# Altium footprint library PCB_Wearing_sensor.PcbLib: 55 footprints (part 2 of 4)
Each footprint in its own frame and in the unit in brackets; x right, y up, seen from the top. Pads: shape width x height; smd on the part's side, far side on the other; paste and mask are expansions set on the pad; w line width, h text height; cw(c..) or ccw(c..) is an arc to the next point about the centre after c.
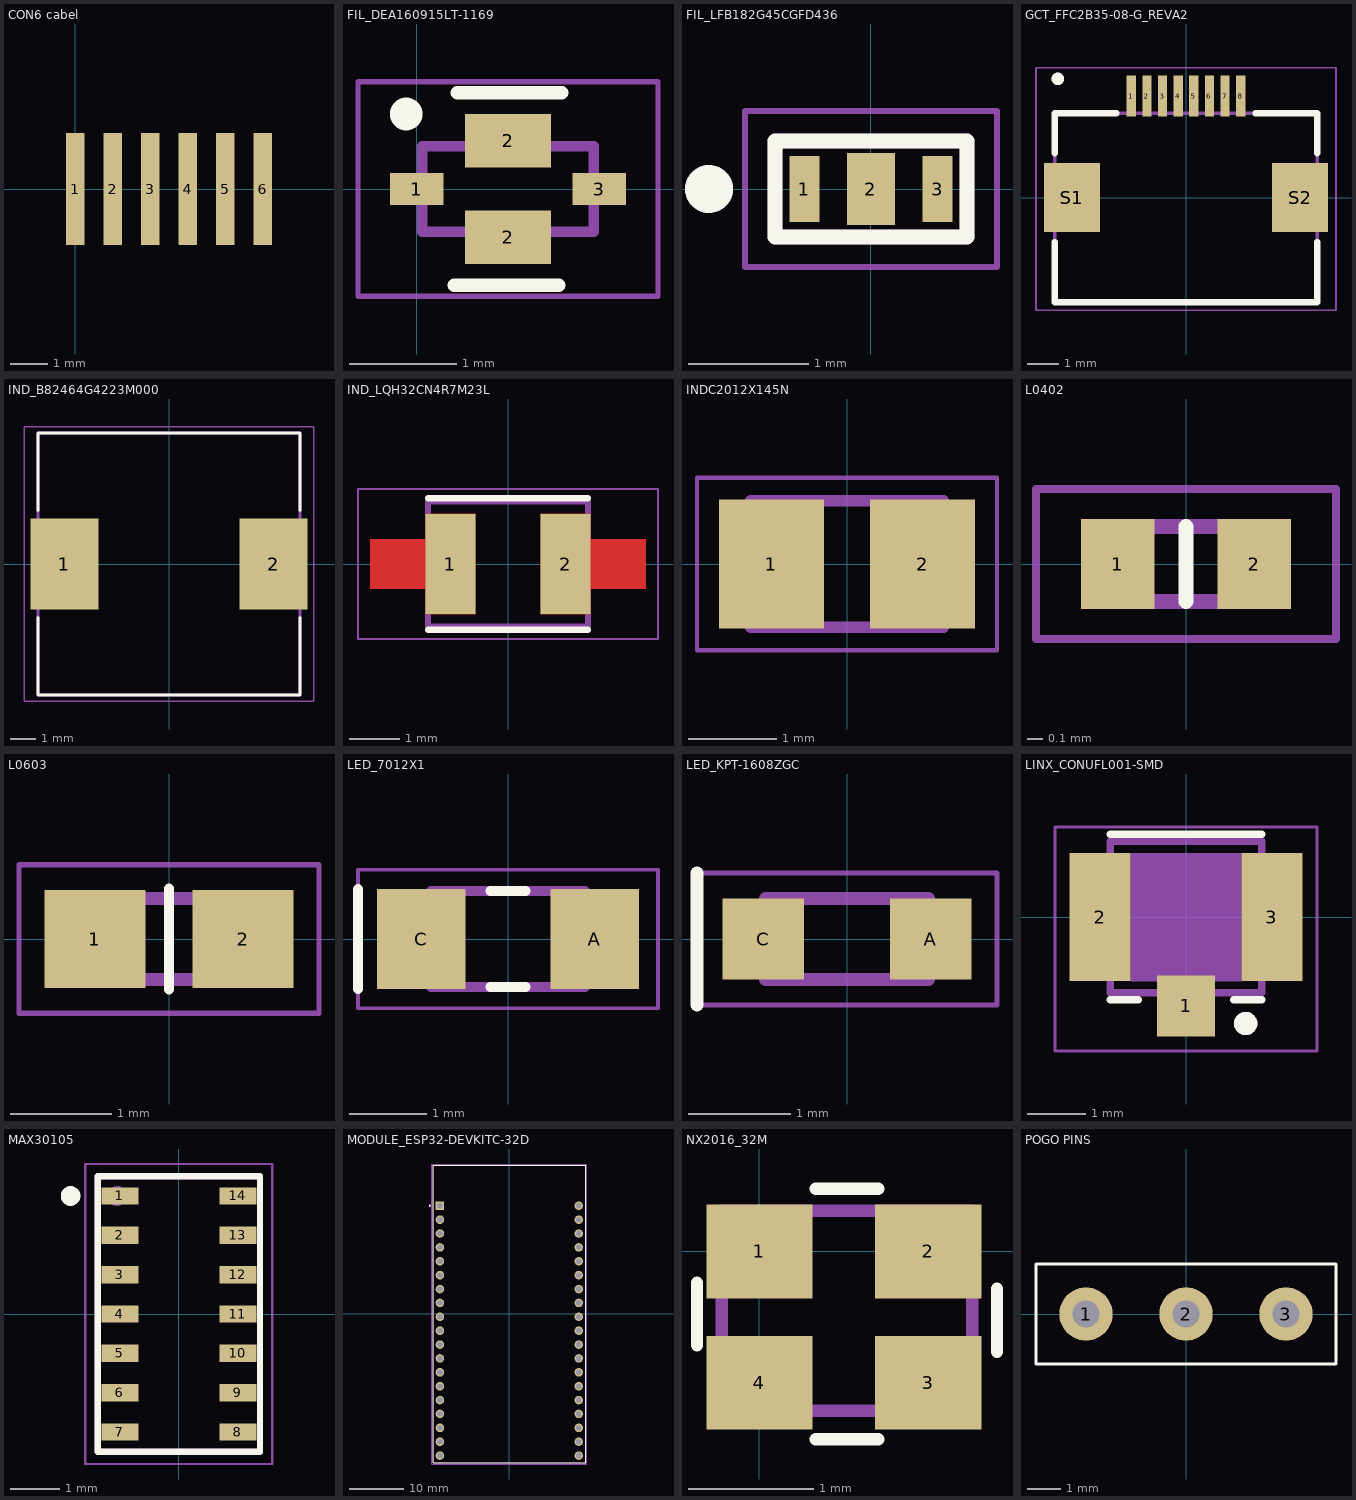
[diagram p1: the footprints below, top view; thin cyan lines are the x and y axes]

## CON6 cabel [mm]
pads (6):
  rect 0.5x3 smd: 1(0,0) 2(1,0) 3(2,0) 4(3,0) 5(4,0) 6(5,0)
Top Assy:
  text ".Designator" at -0.832,-0.32 h1.52

## FIL_DEA160915LT-1169 [mm]
pads (4):
  rect 0.5x0.3 smd: 1(0,0) 3(1.7,0)
  rect 0.8x0.5 smd: 2(0.85,-0.45) 2(0.85,0.45)
Top Overlay:
  circle w0.254: c-0.1,0.7 r0.025
  lines w0.127: 0.35,-0.9 1.325,-0.9 ; 0.375,0.9 1.35,0.9
Top Component Body:
  lines w0.1: 0.05,-0.4 0.05,0.4 1.65,0.4 1.65,-0.4 0.05,-0.4
Top Courtyard (Mech8):
  lines w0.05: -0.55,-1 -0.55,-0.7 -0.55,0.7 -0.55,1 -0.25,1 1.95,1 2.25,1 2.25,0.7 2.25,-0.7 2.25,-1 1.95,-1 0.45,-1 -0.25,-1 -0.55,-1
3D body "User Library-DEA 162450BT.step": height 0.61, standoff -0.01, extent 0.049,-0.401 1.651,0.401

## FIL_LFB182G45CGFD436 [mm]
pads (3):
  rect 0.25x0.55 smd mask+0: 1(-0.555,0) 3(0.555,0)
  rect 0.4x0.6 smd mask+0: 2(0,0)
Top Overlay:
  circle w0.2: c-1.35,0 r0.1
  lines w0.127: -0.8,-0.4 0.8,-0.4 0.8,0.4 -0.8,0.4 -0.8,-0.4
Top Solder:
  region: 0.2,-0.3 -0.2,-0.3 -0.2,0.3 0.2,0.3
  region: 0.68,-0.275 0.43,-0.275 0.43,0.275 0.68,0.275
  region: -0.43,-0.275 -0.68,-0.275 -0.68,0.275 -0.43,0.275
Top Component Body:
  lines w0.127: -0.8,-0.4 -0.8,0.4 0.8,0.4 0.8,-0.4 -0.8,-0.4
Top Assy:
  text ".Designator" at -3.432,-0.345 h1.52
Top Courtyard (Mech8):
  lines w0.05: -1.05,-0.65 -1.05,0.65 1.05,0.65 1.05,-0.65 -1.05,-0.65
Mechanical 13:
  circle w0.2: c-1.35,0 r0.1
3D body "LFB182G45SG9A213.STEP": height 0.8, standoff 0, extent -0.8,-0.4 0.8,0.4

## GCT_FFC2B35-08-G_REVA2 [mm]
height 2
pads (10):
  rect 0.3x1.3 smd: 1(-1.75,3.25) 2(-1.25,3.25) 3(-0.75,3.25) 4(-0.25,3.25) 5(0.25,3.25) 6(0.75,3.25) 7(1.25,3.25) 8(1.75,3.25)
  rect 1.8x2.2 smd: S1(-3.65,0) S2(3.65,0)
Top Overlay:
  circle w0.2: c-4.1,3.8 r0.1
  lines w0.2: -4.2,-1.42 -4.2,-3.35 4.2,-3.35 4.2,-1.42 ; -4.2,1.42 -4.2,2.7 -2.22,2.7 ; 2.22,2.7 4.2,2.7 4.2,1.42
Top Courtyard (Mech8):
  lines w0.05: -4.8,-3.6 -4.8,4.15 4.8,4.15 4.8,-3.6 -4.8,-3.6
Mechanical 13:
  circle w0.2: c-4.1,3.8 r0.1
  lines w0.1: -4.2,-3.35 4.2,-3.35 4.2,2.7 -4.2,2.7 -4.2,-3.35
3D body "FFC2B35-08-G--3DModel-STEP-56544.STEP": height 2, standoff 0, extent -4.2,-3.28 4.2,3.48

## IND_B82464G4223M000 [mm]
height 4.8
pads (2):
  rect 2.7x3.6 smd: 1(-4.15,0) 2(4.15,0)
Top Overlay:
  lines w0.127: -5.2,-2.12 -5.2,-5.2 5.2,-5.2 5.2,-2.12 ; -5.2,2.12 -5.2,5.2 5.2,5.2 5.2,2.12
Top Assy:
  lines w0.127: -5.2,-5.2 -5.2,5.2 5.2,5.2 5.2,-5.2 -5.2,-5.2
Top Courtyard (Mech8):
  lines w0.05: -5.75,-5.45 -5.75,5.45 5.75,5.45 5.75,-5.45 -5.75,-5.45
3D body "B82464G4223M000.STEP": height 4.8, standoff 0, extent -5.2,-5.2 5.2,5.2

## IND_LQH32CN4R7M23L [mm]
pads (2):
  rect 1x2 smd paste-2 mask+0: 1(-1.15,0) 2(1.15,0)
Top Layer:
  region: -0.65,-1 -1.65,-1 -1.65,-0.5 -2.75,-0.5 -2.75,0.5 -1.65,0.5 -1.65,1 -0.65,1
  region: 1.65,0.5 2.75,0.5 2.75,-0.5 1.65,-0.5 1.65,-1 0.65,-1 0.65,1 1.65,1
Top Overlay:
  lines w0.127: -1.6,-1.314 1.6,-1.314 ; -1.6,1.314 1.6,1.314
Top Paste:
  region: -0.65,-1 -1.65,-1 -1.65,-0.5 -2.75,-0.5 -2.75,0.5 -1.65,0.5 -1.65,1 -0.65,1
  region: 1.65,0.5 2.75,0.5 2.75,-0.5 1.65,-0.5 1.65,-1 0.65,-1 0.65,1 1.65,1
Top Solder:
  region: -0.55,-1.1 -1.75,-1.1 -1.75,-0.6 -2.85,-0.6 -2.85,0.6 -1.75,0.6 -1.75,1.1 -0.55,1.1
  region: 1.75,0.6 2.85,0.6 2.85,-0.6 1.75,-0.6 1.75,-1.1 0.55,-1.1 0.55,1.1 1.75,1.1
Top Courtyard (Mech8):
  lines w0.05: -3,-1.5 3,-1.5 3,1.5 -3,1.5 -3,-1.5
Mechanical 13:
  lines w0.127: -1.6,-1.25 1.6,-1.25 1.6,1.25 -1.6,1.25 -1.6,-1.25

## INDC2012X145N [mm]
pads (2):
  rect 1.2x1.47 smd: 1(-0.86,0) 2(0.86,0)
Top Component Body:
  lines w0.127: -1.1,-0.72 -1.1,0.72 1.1,0.72 1.1,-0.72 -1.1,-0.72
Top Assy:
  text ".Designator" at -3.432,-0.345 h1.52
Top Courtyard (Mech8):
  lines w0.05: -1.708,-0.983 1.708,-0.983 1.708,0.983 -1.708,0.983 -1.708,-0.983
3D body "step_temp.STEP": height 1.45, standoff 0, extent -1,-0.625 1,0.625

## L0402 [mm]
pads (2):
  rect 0.49x0.6 smd: 1(-0.455,0) 2(0.455,0)
Top Overlay:
  lines w0.1: 0,-0.25 0,0 0,0.25
Top Component Body:
  lines w0.1: -0.5,-0.25 0.5,-0.25 0.5,0.25 -0.5,0.25 -0.5,-0.25
Top Assy:
  text ".Designator" at -3.432,-0.345 h1.52
Top Courtyard (Mech8):
  lines w0.051: -1,-0.5 -1,0.5 1,0.5 1,-0.5 -1,-0.5
3D body "step_temp.STEP": height 0.44, standoff -0.01, extent -0.5,-0.25 0.5,0.25

## L0603 [mm]
pads (2):
  rect 1x0.97 smd: 1(-0.735,0) 2(0.735,0)
Top Overlay:
  lines w0.1: 0,-0.5 0,0.5
Top Component Body:
  lines w0.127: -0.8,-0.4 -0.8,0.4 0.8,0.4 0.8,-0.4 -0.8,-0.4
Top Assy:
  text ".Designator" at -2.253,-0.226 h1
Top Courtyard (Mech8):
  lines w0.05: -1.485,-0.735 1.485,-0.735 1.485,0.735 -1.485,0.735 -1.485,-0.735
3D body "step_temp.STEP": height 0.95, standoff 0, extent -0.8,-0.4 0.8,0.4

## LED_7012X1 [mm]
height 1
pads (2):
  rect 1.15x1.3 smd: A(1.125,0) C(-1.125,0)
Top Overlay:
  lines w0.127: -1.95,-0.65 -1.95,0.65 ; -0.23,-0.625 0.23,-0.625 ; -0.23,0.625 0.23,0.625
Top Courtyard (Mech8):
  lines w0.05: -1.95,-0.9 1.95,-0.9 1.95,0.9 -1.95,0.9 -1.95,-0.9
Mechanical 13:
  lines w0.127: -1,-0.625 1,-0.625 1,0.625 -1,0.625 -1,-0.625
3D body "step_temp.STEP": height 0.73, standoff 0, extent -1.003,-0.622 1.003,0.622

## LED_KPT-1608ZGC [mm]
pads (2):
  rect 0.8x0.8 smd: A(0.825,0) C(-0.825,0)
Top Overlay:
  lines w0.127: -1.475,-0.65 -1.475,0.65
Top Assy:
  lines w0.127: -0.8,-0.4 0.8,-0.4 0.8,0.4 -0.8,0.4 -0.8,-0.4
Top Courtyard (Mech8):
  lines w0.05: -1.475,-0.65 -1.475,0.65 1.475,0.65 1.475,-0.65 -1.475,-0.65
3D body "KP-1608SURCK.STEP": height 1.1, standoff 0, extent -0.8,-0.4 0.8,0.4

## LINX_CONUFL001-SMD [mm]
pads (3):
  rect 1x1.05 smd: 1(0,-1.525)
  rect 1.05x2.2 smd: 2(-1.475,0) 3(1.475,0)
Top Overlay:
  circle w0.2: c1.025,-1.825 r0.1
  lines w0.127: -1.3,-1.42 -0.82,-1.42 ; -1.3,1.42 1.3,1.42 ; 0.82,-1.42 1.3,-1.42
Top Component Body:
  region: 0.95,-1.1 -0.95,-1.1 -0.95,1.1 0.95,1.1
  lines w0.127: -1.3,-1.3 -1.3,1.3 1.3,1.3 1.3,-1.3 -1.3,-1.3
Top Assy:
  text ".Designator" at -3.432,-0.345 h1.52
Top Courtyard (Mech8):
  lines w0.05: -2.25,-2.3 -2.25,1.55 2.25,1.55 2.25,-2.3 -2.25,-2.3
Mechanical 13:
  circle w0.2: c1.025,-1.825 r0.1
3D body "step_temp.STEP": height 1.3, standoff 0, extent -1.55,-1.5 1.55,1.5

## MAX30105 [mm]
pads (14):
  rect 0.75x0.35 smd: 1(-1.2,2.4) 2(-1.2,1.6) 3(-1.2,0.8) 4(-1.2,0) 5(-1.2,-0.8) 6(-1.2,-1.6) 7(-1.2,-2.4) 8(1.2,-2.4) 9(1.2,-1.6) 10(1.2,-0.8) 11(1.2,0) 12(1.2,0.8) 13(1.2,1.6) 14(1.2,2.4)
Top Overlay:
  circle w0.2: c-2.2,2.4 r0.1
  lines w0.127: -1.65,-2.8 1.65,-2.8 1.65,2.8 -1.65,2.8 -1.65,-2.8
Top Component Body:
  lines w0.127: -1.65,-2.8 1.65,-2.8 1.65,2.8 -1.65,2.8 -1.65,-2.8
Top Assy:
  text ".Designator" at -3.432,-0.345 h1.52
Top Courtyard (Mech8):
  lines w0.05: -1.9,-3.05 -1.9,3.05 1.9,3.05 1.9,-3.05 -1.9,-3.05
Mechanical 13:
  circle w0.2: c-1.25,2.4 r0.1
3D body "MAX30105EFD+.STEP": height 1.65, standoff 0, extent -1.65,-2.8 1.65,2.8

## MODULE_ESP32-DEVKITC-32D [mm]
pads (38):
  rect 1.56x1.56 / inner round 1.56 / far side rect 1.56x1.56 hole 1.04: J2-1(-12.7,19.76)
  round 1.56 hole 1.04: J2-2(-12.7,17.22) J2-3(-12.7,14.68) J2-4(-12.7,12.14) J2-5(-12.7,9.6) J2-6(-12.7,7.06) J2-7(-12.7,4.52) J2-8(-12.7,1.98) J2-9(-12.7,-0.56) J2-10(-12.7,-3.1) J2-11(-12.7,-5.64) J2-12(-12.7,-8.18) J2-13(-12.7,-10.72) J2-14(-12.7,-13.26) J2-15(-12.7,-15.8) J2-16(-12.7,-18.34) J2-17(-12.7,-20.88) J2-18(-12.7,-23.42) J2-19(-12.7,-25.96) J3-1(12.7,19.76) J3-2(12.7,17.22) J3-3(12.7,14.68) J3-4(12.7,12.14) J3-5(12.7,9.6) J3-6(12.7,7.06) J3-7(12.7,4.52) J3-8(12.7,1.98) J3-9(12.7,-0.56) J3-10(12.7,-3.1) J3-11(12.7,-5.64) J3-12(12.7,-8.18) J3-13(12.7,-10.72) J3-14(12.7,-13.26) J3-15(12.7,-15.8) J3-16(12.7,-18.34) J3-17(12.7,-20.88) J3-18(12.7,-23.42) J3-19(12.7,-25.96)
Top Overlay:
  circle w0.2: c-14.6,19.76 r0.1
  lines w0.127: -13.95,-27.25 -13.95,27.15 13.95,27.15 13.95,-27.25 -13.95,-27.25
Top Courtyard (Mech8):
  lines w0.05: -14.2,-27.5 14.2,-27.5 14.2,27.4 -14.2,27.4 -14.2,-27.5
Mechanical 13:
  circle w0.2: c-14.6,19.76 r0.1
  lines w0.127: -13.95,-27.25 13.95,-27.25 13.95,27.15 -13.95,27.15 -13.95,-27.25
3D body "step_temp.STEP": height 6.69, standoff -6, extent -13.97,-27.9 13.97,27.2

## NX2016_32M [mm] "Crystal 32M"
pads (4):
  rect 0.85x0.75 smd: 1(0,0) 2(1.35,0) 3(1.35,-1.05) 4(0,-1.05)
Top Overlay:
  lines w0.1: -0.5,-0.75 -0.5,-0.25 ; 0.45,-1.5 0.95,-1.5 ; 0.45,0.5 0.95,0.5 ; 1.9,-0.8 1.9,-0.3
Top Component Body:
  lines w0.1: -0.3,-1.275 1.7,-1.275 1.7,0.325 -0.3,0.325 -0.3,-1.275
Top Assy:
  text ".Designator" at -2.732,-0.845 h1.52
3D body "NX2016SA-40M-STD-CZS-3--3DModel-STEP-510211.STEP": height 0.5, standoff 0, extent -0.287,-1.276 1.713,0.324

## POGO PINS [mm]
pads (3):
  round 1.6 hole 0.8: 1(-3,0) 2(0,0) 3(3,0)
Top Overlay:
  lines w0.1: -4.5,-1.5 4.5,-1.5 4.5,1.5 -4.5,1.5 -4.5,-1.5